# Altium footprint library MPBoard.PcbLib: 123 footprints (part 3 of 8)
Each footprint in its own frame and in the unit in brackets; x right, y up, seen from the top. Pads: shape width x height; smd on the part's side, far side on the other; paste and mask are expansions set on the pad; w line width, h text height; cw(c..) or ccw(c..) is an arc to the next point about the centre after c.
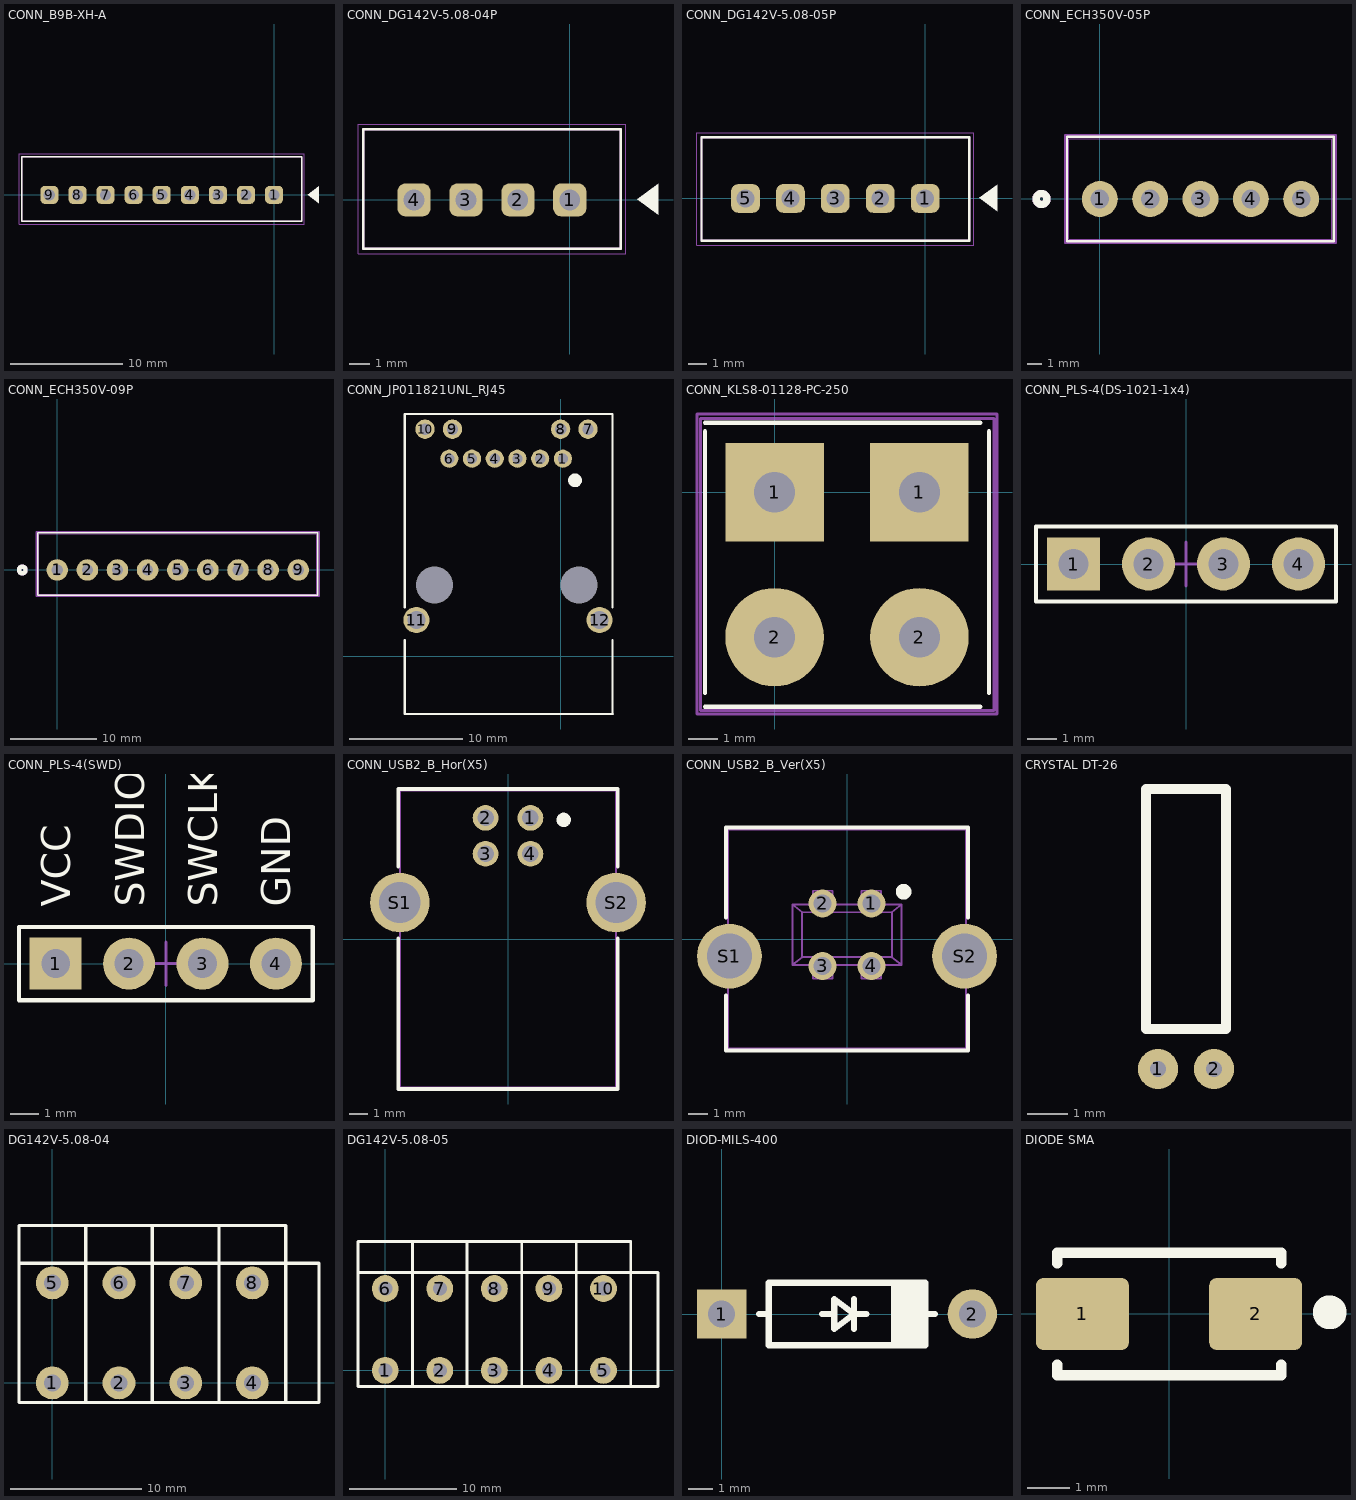
[diagram p2: the footprints below, top view; thin cyan lines are the x and y axes]

## CONN_B9B-XH-A [mm] "JST"
pads (9):
  rrect50% 1.6x1.6 hole 1: 1(0,0) 2(-2.5,0) 3(-5,0) 4(-7.5,0) 5(-10,0) 6(-12.5,0) 7(-15,0) 8(-17.5,0) 9(-20,0)
Top Overlay:
  region: 4,-0.75 3,0 4,0.75
  lines w0.127: -22.45,-2.35 -22.45,3.4 2.45,3.4 2.45,-2.35 -22.45,-2.35
Mechanical 13:
  lines w0.127: -22.45,-2.35 -22.45,3.4 2.45,3.4 2.45,-2.35 -22.45,-2.35
Mechanical 15:
  lines w0.05: -22.7,-2.6 2.7,-2.6 2.7,3.65 -22.7,3.65 -22.7,-2.6
3D body "step_temp.STEP": height 7, standoff -3.4, extent -22.45,-2.35 2.45,3.4

## CONN_DG142V-5.08-04P [mm] "Degson"
pads (4):
  rrect50% 1.6x1.6 hole 1: 1(0,0) 2(-2.5,0) 3(-5,0) 4(-7.5,0)
Top Overlay:
  region: 4.25,-0.725 3.25,0.025 4.25,0.775
  lines w0.127: -9.95,-2.35 -9.95,3.4 2.45,3.4 2.45,-2.35 -9.95,-2.35
Mechanical 13:
  lines w0.127: -9.95,-2.35 -9.95,3.4 2.45,3.4 2.45,-2.35 -9.95,-2.35
Mechanical 15:
  lines w0.05: -10.2,-2.6 2.7,-2.6 2.7,3.65 -10.2,3.65 -10.2,-2.6

## CONN_DG142V-5.08-05P [mm] "Degson"
pads (5):
  rrect50% 1.6x1.6 hole 1: 1(0,0) 2(-2.5,0) 3(-5,0) 4(-7.5,0) 5(-10,0)
Top Overlay:
  region: 4,-0.725 3,0.025 4,0.775
  lines w0.127: -12.45,-2.35 -12.45,3.4 2.45,3.4 2.45,-2.35 -12.45,-2.35
Mechanical 13:
  lines w0.127: -12.45,-2.35 -12.45,3.4 2.45,3.4 2.45,-2.35 -12.45,-2.35
Mechanical 15:
  lines w0.05: -12.7,-2.6 2.7,-2.6 2.7,3.65 -12.7,3.65 -12.7,-2.6

## CONN_ECH350V-05P [mm] "Dinkle"
pads (5):
  round 2.5 hole 1.3 mask+0: 1(0,0) 2(3.5,0) 3(7,0) 4(10.5,0) 5(14,0)
Top Overlay:
  circle w0.508: c-4.059,0 r0.381
  lines w0.152: -2.281,-2.937 16.275,-2.937 16.275,4.327 -2.281,4.327 -2.281,-2.937
Bottom Overlay:
  circle w0.508: c-4.059,0 r0.381
Mechanical 13:
  circle w0.508: c-4.059,0 r0.381
  lines w0.025: 16.146,-2.604 16.146,-2.81 ; 16.146,-2.81 -2.154,-2.81 -2.154,4.2 16.146,4.2 16.146,-2.81
Mechanical 15:
  lines w0.152: -2.408,-3.064 16.425,-3.064 16.425,4.454 -2.408,4.454 -2.408,-3.064
3D body: height 0.25, standoff 0, extent 0,0 0.254,0.254
3D body: height 0.7, standoff 0, extent -2.154,-2.81 16.146,4.2
3D body: height 9.2, standoff 0, extent -2.159,3.44 16.146,4.2
3D body: height 9.2, standoff 0, extent -2.154,-2.81 16.15,-2.05
3D body: height 7.2, standoff -3.4, extent 13.59,-0.41 14.41,0.41
3D body: height 7.2, standoff -3.4, extent 10.09,-0.41 10.91,0.41
3D body: height 7.2, standoff -3.4, extent 6.59,-0.41 7.41,0.41
3D body: height 7.2, standoff -3.4, extent 3.09,-0.41 3.91,0.41
3D body: height 7.2, standoff -3.4, extent -0.41,-0.41 0.41,0.41
3D body: height 9.2, standoff 0, extent -2.154,-2.81 -1.4,4.2
3D body: height 9.2, standoff 0, extent 15.4,-2.81 16.154,4.2
3D body: height 9.2, standoff 0, extent 1.396,-2.825 2.15,4.185
3D body: height 9.2, standoff 0, extent 4.873,-2.8 5.627,4.21
3D body: height 9.2, standoff 0, extent 8.373,-2.825 9.127,4.185
3D body: height 9.2, standoff 0, extent 11.873,-2.825 12.627,4.185
3D body: height 9.2, standoff 0, extent 11.25,2.25 13.25,2.75
3D body: height 9.2, standoff 0, extent 7.75,2.25 9.75,2.75
3D body: height 9.2, standoff 0, extent 4.25,2.25 6.25,2.75
3D body: height 9.2, standoff 0, extent 0.75,2.25 2.75,2.75
3D body: height 9.2, standoff 0, extent -2.15,2.25 -0.8,2.75
3D body: height 9.2, standoff 0, extent 14.8,2.25 16.15,2.75

## CONN_ECH350V-09P [mm] "Dinkle"
pads (9):
  round 2.5 hole 1.3 mask+0: 1(0,0) 2(3.5,0) 3(7,0) 4(10.5,0) 5(14,0) 6(17.5,0) 7(21,0) 8(24.5,0) 9(28,0)
Top Overlay:
  circle w0.508: c-4.059,0 r0.381
  lines w0.152: -2.281,-2.937 30.281,-2.937 30.281,4.327 -2.281,4.327 -2.281,-2.937
Bottom Overlay:
  circle w0.508: c-4.059,0 r0.381
Mechanical 13:
  circle w0.508: c-4.059,0 r0.381
  lines w0.025: -2.154,-2.81 30.154,-2.81 30.154,4.2 -2.154,4.2 -2.154,-2.81
Mechanical 15:
  lines w0.152: -2.408,-3.064 -2.408,4.454 30.408,4.454 30.408,-3.064 -2.408,-3.064
3D body: height 0.25, standoff 0, extent 0,0 0.254,0.254
3D body: height 9.2, standoff 0, extent 28.8,2.25 30.15,2.75
3D body: height 9.2, standoff 0, extent -2.15,2.25 -0.8,2.75
3D body: height 9.2, standoff 0, extent 0.75,2.25 2.75,2.75
3D body: height 9.2, standoff 0, extent 4.25,2.25 6.25,2.75
3D body: height 9.2, standoff 0, extent 7.75,2.25 9.75,2.75
3D body: height 9.2, standoff 0, extent 11.25,2.25 13.25,2.75
3D body: height 9.2, standoff 0, extent 14.75,2.25 16.75,2.75
3D body: height 9.2, standoff 0, extent 18.25,2.25 20.25,2.75
3D body: height 9.2, standoff 0, extent 21.75,2.25 23.75,2.75
3D body: height 9.2, standoff 0, extent 25.871,-2.81 26.625,4.2
3D body: height 9.2, standoff 0, extent 22.398,-2.8 23.152,4.21
3D body: height 9.2, standoff 0, extent 18.873,-2.8 19.627,4.21
3D body: height 9.2, standoff 0, extent 15.371,-2.81 16.125,4.2
3D body: height 9.2, standoff 0, extent 11.873,-2.825 12.627,4.185
3D body: height 9.2, standoff 0, extent 8.373,-2.825 9.127,4.185
3D body: height 9.2, standoff 0, extent 4.873,-2.8 5.627,4.21
3D body: height 9.2, standoff 0, extent 1.396,-2.825 2.15,4.185
3D body: height 9.2, standoff 0, extent 29.4,-2.81 30.154,4.2
3D body: height 9.2, standoff 0, extent -2.154,3.446 30.15,4.2
3D body: height 9.2, standoff 0, extent -2.154,-2.81 -1.4,4.2
3D body: height 7.2, standoff -3.4, extent -0.41,-0.41 0.41,0.41
3D body: height 7.2, standoff -3.4, extent 3.09,-0.41 3.91,0.41
3D body: height 7.2, standoff -3.4, extent 6.59,-0.41 7.41,0.41
3D body: height 7.2, standoff -3.4, extent 10.09,-0.41 10.91,0.41
3D body: height 7.2, standoff -3.4, extent 13.59,-0.41 14.41,0.41
3D body: height 7.2, standoff -3.4, extent 17.09,-0.41 17.91,0.41
3D body: height 7.2, standoff -3.4, extent 20.59,-0.41 21.41,0.41
3D body: height 7.2, standoff -3.4, extent 24.09,-0.41 24.91,0.41
3D body: height 7.2, standoff -3.4, extent 27.59,-0.41 28.41,0.41
3D body: height 9.2, standoff 0, extent -2.154,-2.81 30.15,-2.056
3D body: height 9.2, standoff 0, extent 25.25,2.25 27.25,2.75
3D body: height 0.8, standoff 0, extent -2.154,-2.81 30.154,4.2

## CONN_JP011821UNL_RJ45 [mm]
pads (14):
  round 1.6 hole 0.9 paste-0.699 mask+0: 1(0.2,17.4) 2(-1.8,17.4) 3(-3.8,17.4) 4(-5.8,17.4) 5(-7.8,17.4) 6(-9.8,17.4)
  round 1.7 hole 1 paste-0.699 mask+0: 7(2.413,20) 8(0,20) 9(-9.525,20) 10(-11.938,20)
  round 2.3 hole 1.57 paste-0.699 mask+0: 11(-12.7,3.2) 12(3.429,3.2)
  round 1.524 / inner round 1.524 / far side round 3.759 hole 3.25 paste-1.88 mask-1.88: ""(-11.1,6.3) ""(1.6,6.3)
Top Overlay:
  circle w0.7: c1.27,15.494 r0.25
  lines w0.2: -13.728,21.336 4.572,21.336 ; -13.716,1.425 -13.716,-5.075 4.584,-5.075 ; -13.716,4.312 -13.716,21.312 ; 4.572,-5.075 4.572,1.425 ; 4.572,4.312 4.572,21.312
3D body "JP011821UNL_3D.STEP": height 14.21, standoff -3.61, extent -14.346,-4.653 4.471,20.847

## CONN_KLS8-01128-PC-250 [mm] "KLS"
pads (4):
  rect 3.4x3.4 hole 1.4: 1(0,0) 1(5,0)
  round 3.4 hole 1.4: 2(0,-5) 2(5,-5)
Top Overlay:
  lines w0.15: -2.4,-7.4 7.1,-7.4 ; -2.4,-6.925 -2.4,2.1 ; -2.4,2.4 7.1,2.4 ; 7.4,-6.925 7.4,2.1
Top Component Outline:
  lines w0.1: -2.55,-7.525 7.575,-7.525 7.575,2.55 -2.55,2.55 -2.55,-7.525
Top Courtyard:
  lines w0.1: -2.675,-7.65 7.675,-7.65 7.675,2.7 5.088,2.7 -0.088,2.7 -2.675,2.7 -2.675,-7.65

## CONN_PLS-4(DS-1021-1x4) [mm] "2.54mm"
pads (4):
  rect 1.8x1.8 hole 1: 1(-3.81,0)
  round 1.8 hole 1: 2(-1.27,0) 3(1.27,0) 4(3.81,0)
Top Overlay:
  lines w0.15: -5.08,-1.27 -5.08,1.27 5.08,1.27 5.08,-1.27 -5.08,-1.27
Top Component Outline:
  circle w0.5: c-3.81,0 r0.25
  lines w0.1: -5.08,-1.27 -5.08,1.27 5.08,1.27 5.08,-1.27 -5.08,-1.27
Top Courtyard:
  lines w0.1: -0.75,0 0.75,0 ; 0,-0.75 0,0.75 ; -5.08,-1.27 5.08,-1.27 5.08,1.27 -5.08,1.27 -5.08,-1.27
3D body "PLS 4.STEP": height 8.54, standoff -3, extent -5.08,-1.27 5.08,1.27

## CONN_PLS-4(SWD) [mm] "2.54mm"
pads (4):
  rect 1.8x1.8 hole 1: 1(-3.81,0)
  round 1.8 hole 1: 2(-1.27,0) 3(1.27,0) 4(3.81,0)
Top Overlay:
  lines w0.15: -5.08,-1.27 -5.08,1.27 5.08,1.27 5.08,-1.27 -5.08,-1.27
  text "VCC" at -3.3,1.975 h1
  text "SWCLK" at 1.775,1.975 h1
  text "GND" at 4.3,1.975 h1
  text "SWDIO" at -0.75,1.975 h1
Top Component Outline:
  circle w0.5: c-3.81,0 r0.25
  lines w0.1: -5.08,-1.27 5.08,-1.27 5.08,1.27 -5.08,1.27 -5.08,-1.27
Top Courtyard:
  lines w0.1: -0.75,0 0.75,0 ; 0,-0.75 0,0.75 ; -5.08,-1.27 -5.08,1.27 5.08,1.27 5.08,-1.27 -5.08,-1.27
3D body "PLS 4.STEP": height 8.54, standoff -3, extent -5.08,-1.27 5.08,1.27

## CONN_USB2_B_Hor(X5) [mm] "Wurth Elektronik"
pads (6):
  round 1.428 hole 0.92: 1(1.25,6.74) 2(-1.25,6.74) 3(-1.25,4.74) 4(1.25,4.74)
  round 3.316 hole 2.3: S1(-6.02,2.03) S2(6.02,2.03)
Top Overlay:
  circle w0.4: c3.1,6.63 r0.2
  lines w0.2: -6.12,0.03 -6.12,-8.35 6.12,-8.35 6.12,0.03 ; -6.12,4.03 -6.12,8.35 6.12,8.35 6.12,4.03
Mechanical 13:
  lines w0.1: -6.02,-8.25 6.02,-8.25 6.02,8.25 -6.02,8.25 -6.02,-8.25
3D body "step_temp.STEP": height 11.05, standoff -3.81, extent -7.484,-8.25 7.484,8.25

## CONN_USB2_B_Ver(X5) [mm] "Wurth Elektronik"
pads (6):
  round 1.428 hole 0.92: 1(1.25,1.82) 2(-1.25,1.82) 3(-1.25,-1.38) 4(1.25,-1.38)
  round 3.316 hole 2.3: S1(-6.02,-0.88) S2(6.02,-0.88)
Top Overlay:
  circle w0.4: c2.9,2.42 r0.2
  lines w0.2: -6.2,-2.9 -6.2,-5.7 6.2,-5.7 6.2,-2.9 ; -6.2,1.1 -6.2,5.7 6.2,5.7 6.2,1.1
Mechanical 13:
  lines w0.1: -1.75,1.82 -1.75,2.47 -0.75,2.47 -0.75,1.82 ; 0.75,1.82 0.75,2.47 1.75,2.47 1.75,1.82 ; -2.8,-1.33 -2.3,-0.93 ; -2.8,-1.33 -2.8,1.77 ; -2.8,-1.33 2.8,-1.33 ; -2.8,1.77 -2.3,1.37 ; -2.8,1.77 2.8,1.77 ; -2.3,-0.93 -2.3,1.37 ; -2.3,-0.93 2.3,-0.93 ; -2.3,1.37 2.3,1.37 ; 2.3,-0.93 2.8,-1.33 ; 2.3,-0.93 2.3,1.37 ; 2.3,1.37 2.8,1.77 ; 2.8,-1.33 2.8,1.77 ; -6.1,-5.6 6.1,-5.6 6.1,5.6 -6.1,5.6 -6.1,-5.6
  lines w0.102: -1.75,-1.38 -1.75,-2.03 -0.75,-2.03 -0.75,-1.38 ; 0.75,-1.38 0.75,-2.03 1.75,-2.03 1.75,-1.38
3D body "61400413321.stp": height 16.11, standoff -4.2, extent -7.345,-5.625 7.355,5.575

## CRYSTAL DT-26 [mm]
pads (2):
  round 1 hole 0.4: 1(-1270,-1270) 2(-1268.6,-1270)
Top Overlay:
  lines w0.25: -1270.3,-1269 -1270.3,-1263 -1268.3,-1263 -1268.3,-1269 -1270.3,-1269
3D body "crystal_DT-26.step": height 2, standoff -2, extent -1270.3,-1270.14 -1268.3,-1263

## DG142V-5.08-04 [mm]
height 1.3
pads (8):
  round 2.5 hole 1.3: 1(0,0) 2(5.08,0) 3(10.16,0) 4(15.24,0) 5(0,7.62) 6(5.08,7.62) 7(10.16,7.62) 8(15.24,7.62)
Top Overlay:
  lines w0.25: -2.54,9.12 20.32,9.12 20.32,-1.5 -2.54,-1.5 -2.54,12 17.78,12 17.78,-1.5 ; 2.54,-1.5 2.54,12 ; 7.62,-1.5 7.62,12 ; 12.7,-1.5 12.7,12
3D body "dg142v-508-04.stp": height 14.2, standoff -3.4, extent -2.55,-1.4 20.47,12

## DG142V-5.08-05 [mm]
height 1.3
pads (10):
  round 2.5 hole 1.3: 1(0,0) 2(5.08,0) 3(10.16,0) 4(15.24,0) 5(20.32,0) 6(0,7.62) 7(5.08,7.62) 8(10.16,7.62) 9(15.24,7.62) 10(20.32,7.62)
Top Overlay:
  lines w0.25: -2.54,9.12 25.4,9.12 25.4,-1.5 -2.54,-1.5 -2.54,12 22.86,12 22.86,-1.5 ; 2.54,-1.5 2.54,12 ; 7.62,-1.5 7.62,12 ; 12.7,-1.5 12.7,12 ; 17.78,-1.5 17.78,12
3D body "dg142v-508-05.stp": height 14.2, standoff -3.4, extent -2.55,-1.4 25.55,12

## DIOD-MILS-400 [mm]
pads (2):
  rect 2x2 hole 1.1: 1(0,0)
  round 2 hole 1.1: 2(10.16,0)
Top Overlay:
  region: 6.985,-1.27 8.255,-1.27 8.255,1.27 6.985,1.27
  lines w0.25: 1.524,0 1.905,0 ; 4.063,0 4.563,0 ; 5.363,-0.6 5.363,0.6 ; 5.863,0 5.363,0 ; 6.985,-1.27 6.985,1.27 ; 8.255,0 8.636,0 ; 5.363,0 4.563,-0.6 4.563,0.6 5.363,0 ; 1.905,-1.27 1.905,1.27 8.255,1.27 8.255,-1.27 1.905,-1.27
3D body "DIOD-MILS-400.STEP": height 2.7, standoff -2.5, extent -0.475,-1.351 10.585,1.351

## DIODE SMA [mm]
pads (2):
  rrect20% 2.2x1.7 smd: 1(-2.05,0) 2(2.05,0)
Top Overlay:
  circle w0.5: c3.8,0.04 r0.15
  lines w0.25: -2.65,-1.2 -2.65,-1.45 2.65,-1.45 2.65,-1.2 ; -2.65,1.2 -2.65,1.45 2.65,1.45 2.65,1.2
3D body "diod_sma.stp": height 2.29, standoff 0, extent -2.743,-1.397 2.743,1.397